# Altium footprint library SWLIB(150721).PcbLib: 348 footprints (part 9 of 22)
Each footprint in its own frame and in the unit in brackets; x right, y up, seen from the top. Pads: shape width x height; smd on the part's side, far side on the other; paste and mask are expansions set on the pad; w line width, h text height; cw(c..) or ccw(c..) is an arc to the next point about the centre after c.
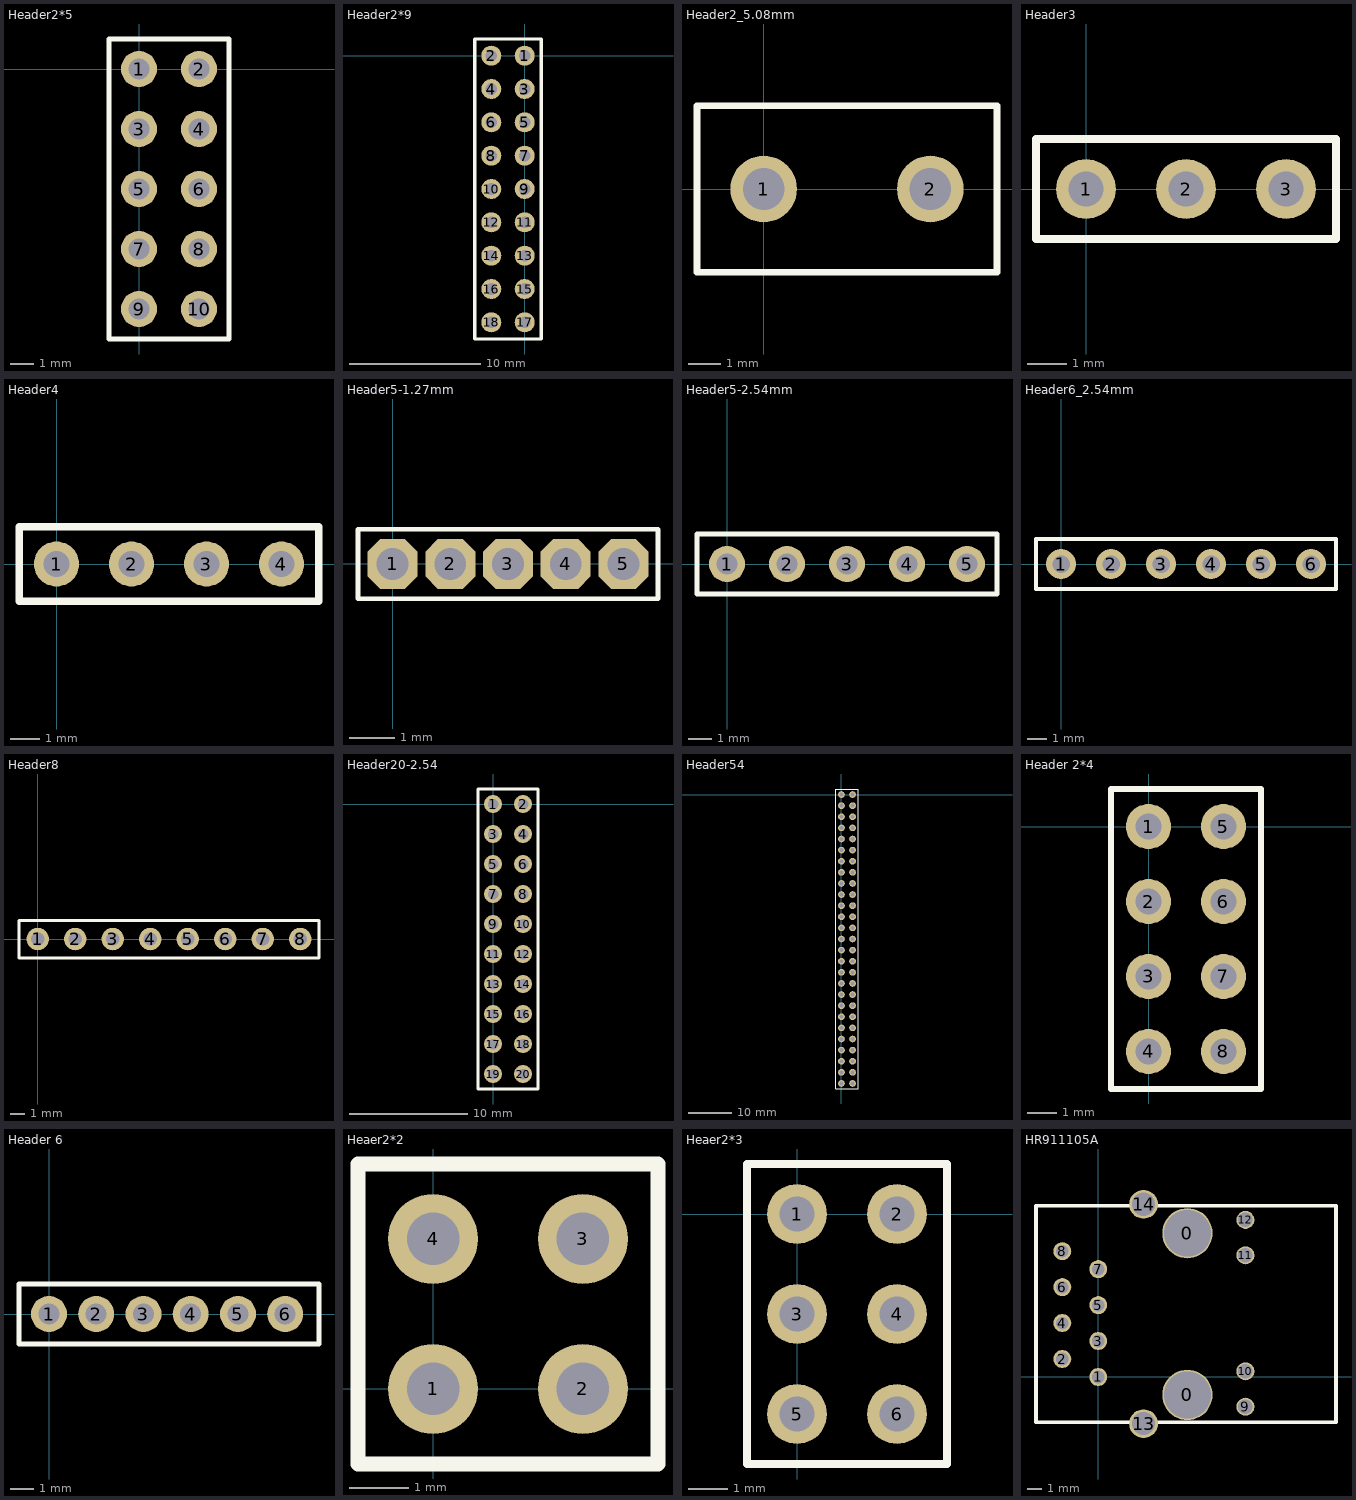
[diagram p8: the footprints below, top view; thin cyan lines are the x and y axes]

## Header2*5 [mil]
pads (10):
  round 60 hole 35: 1(0,0) 2(100,0) 3(0,-100) 4(100,-100) 5(0,-200) 6(100,-200) 7(0,-300) 8(100,-300) 9(0,-400) 10(100,-400)
Top Overlay:
  lines w8: -50,-450 150,-450 150,50 -50,50 -50,-450

## Header2*9 [mil] "2.54 ov7670,ov2460"
pads (18):
  round 60 hole 35: 1(0,0) 2(-100,0) 3(0,-100) 4(-100,-100) 5(0,-200) 6(-100,-200) 7(0,-300) 8(-100,-300) 9(0,-400) 10(-100,-400) 11(0,-500) 12(-100,-500) 13(0,-600) 14(-100,-600) 15(0,-700) 16(-100,-700) 17(0,-800) 18(-100,-800)
Top Overlay:
  lines w10: -150,-850 50,-850 50,50 -150,50 -150,-850

## Header2_5.08mm [mil]
pads (2):
  round 80 hole 50: 1(0,0) 2(200,0)
Top Overlay:
  lines w8: -80,-100 -80,100 -50,100 280,100 280,-100 -80,-100

## Header3 [mil] "2.54mm"
pads (3):
  round 60 hole 35: 1(0,0) 2(100,0) 3(200,0)
Top Overlay:
  lines w8: -50,-50 250,-50 250,50 -50,50 -50,-50

## Header4 [mil] "2.54mm"
pads (4):
  round 60 hole 35: 1(0,0) 2(100,0) 3(200,0) 4(300,0)
Top Overlay:
  lines w10: -50,-50 -50,50 350,50 350,-50 -50,-50

## Header5-1.27mm [mm]
pads (5):
  oct 1.1x1.1 hole 0.7: 1(0,0) 2(1.27,0) 3(2.54,0) 4(3.81,0) 5(5.08,0)
Top Overlay:
  lines w0.1: -0.762,-0.762 5.842,-0.762 5.842,0.762 -0.762,0.762 -0.762,-0.762

## Header5-2.54mm [mil]
pads (5):
  round 60 hole 35: 1(0,0) 2(100,0) 3(200,0) 4(300,0) 5(400,0)
Top Overlay:
  lines w8: -50,-50 450,-50 450,50 50,50 -50,50 -50,-50

## Header6_2.54mm [mil]
pads (6):
  round 60 hole 35: 1(0,0) 2(100,0) 3(200,0) 4(300,0) 5(400,0) 6(500,0)
Top Overlay:
  lines w8: -50,-50 -50,50 550,50 550,-50 -50,-50

## Header8 [mil] "2.54mm"
pads (8):
  round 60 hole 35: 1(0,0) 2(100,0) 3(200,0) 4(300,0) 5(400,0) 6(500,0) 7(600,0) 8(700,0)
Top Overlay:
  lines w8: -50,-50 -50,50 750,50 750,-50 -50,-50

## Header20-2.54 [mil] "JATG"
pads (20):
  round 60 hole 35: 1(0,0) 2(100,0) 3(0,-100) 4(100,-100) 5(0,-200) 6(100,-200) 7(0,-300) 8(100,-300) 9(0,-400) 10(100,-400) 11(0,-500) 12(100,-500) 13(0,-600) 14(100,-600) 15(0,-700) 16(100,-700) 17(0,-800) 18(100,-800) 19(0,-900) 20(100,-900)
Top Overlay:
  lines w10: -50,-950 150,-950 150,50 -50,50 -50,-950

## Header54 [mil] "2.54mm"
pads (54):
  round 60 hole 35: 1(0,0) 2(100,0) 3(0,-100) 4(100,-100) 5(0,-200) 6(100,-200) 7(0,-300) 8(100,-300) 9(0,-400) 10(100,-400) 11(0,-500) 12(100,-500) 13(0,-600) 14(100,-600) 15(0,-700) 16(100,-700) 17(0,-800) 18(100,-800) 19(0,-900) 20(100,-900) 21(0,-1000) 22(100,-1000) 23(0,-1100) 24(100,-1100) 25(0,-1200) 26(100,-1200) 27(0,-1300) 28(100,-1300) 29(0,-1400) 30(100,-1400) 31(0,-1500) 32(100,-1500) 33(0,-1600) 34(100,-1600) 35(0,-1700) 36(100,-1700) 37(0,-1800) 38(100,-1800) 39(0,-1900) 40(100,-1900) 41(0,-2000) 42(100,-2000) 43(0,-2100) 44(100,-2100) 45(0,-2200) 46(100,-2200) 47(0,-2300) 48(100,-2300) 49(0,-2400) 50(100,-2400) 51(0,-2500) 52(100,-2500) 53(0,-2600) 54(100,-2600)
Top Overlay:
  lines w10: -50,-2650 150,-2650 150,-950 150,50 -50,50 -50,-950 -50,-2650

## Header 2*4 [mil] "2.54mm"
pads (8):
  round 60 hole 35: 1(0,0) 2(0,-100) 3(0,-200) 4(0,-300) 5(100,0) 6(100,-100) 7(100,-200) 8(100,-300)
Top Overlay:
  lines w8: -50,-350 150,-350 150,50 -50,50 -50,-350

## Header 6 [mil] "2.0mm"
pads (6):
  round 60 hole 35: 1(0,0) 2(78.74,0) 3(157.48,0) 4(236.22,0) 5(314.96,0) 6(393.7,0)
Top Overlay:
  lines w8: -50,-50 450,-50 450,50 -50,50 -50,-50

## Heaer2*2 [mil] "100mil"
pads (4):
  round 60 hole 35: 1(0,0) 2(100,0) 3(100,100) 4(0,100)
Top Overlay:
  lines w10: -50,-50 -50,150 150,150 150,-50 -50,-50

## Heaer2*3 [mil]
pads (6):
  round 60 hole 35: 1(0,0) 2(100,0) 3(0,-100) 4(100,-100) 5(0,-200) 6(100,-200)
Top Overlay:
  lines w8: -50,-250 -50,50 150,50 150,-250 -50,-250

## HR911105A [mil]
pads (16):
  round 140 hole 130: 0(248.03,-50) 0(248.03,400)
  round 50 hole 35: 1(0,0) 2(-100,50) 3(0,100) 4(-100,150) 5(0,200) 6(-100,250) 7(0,300) 8(-100,350)
  round 50 hole 40: 9(409.45,-82.68) 10(409.45,15.75) 11(409.45,338.58) 12(409.45,437.01)
  round 80 hole 64: 13(125.98,-129.92)
  round 80 hole 65: 14(125.98,480.31)
Top Overlay:
  lines w10: -173.23,-125.98 661.42,-125.98 661.42,476.38 -173.23,476.38 -173.23,-125.98